# Altium footprint library Supernova Connectors.PcbLib: 303 footprints (part 13 of 19)
Each footprint in its own frame and in the unit in brackets; x right, y up, seen from the top. Pads: shape width x height; smd on the part's side, far side on the other; paste and mask are expansions set on the pad; w line width, h text height; cw(c..) or ccw(c..) is an arc to the next point about the centre after c.
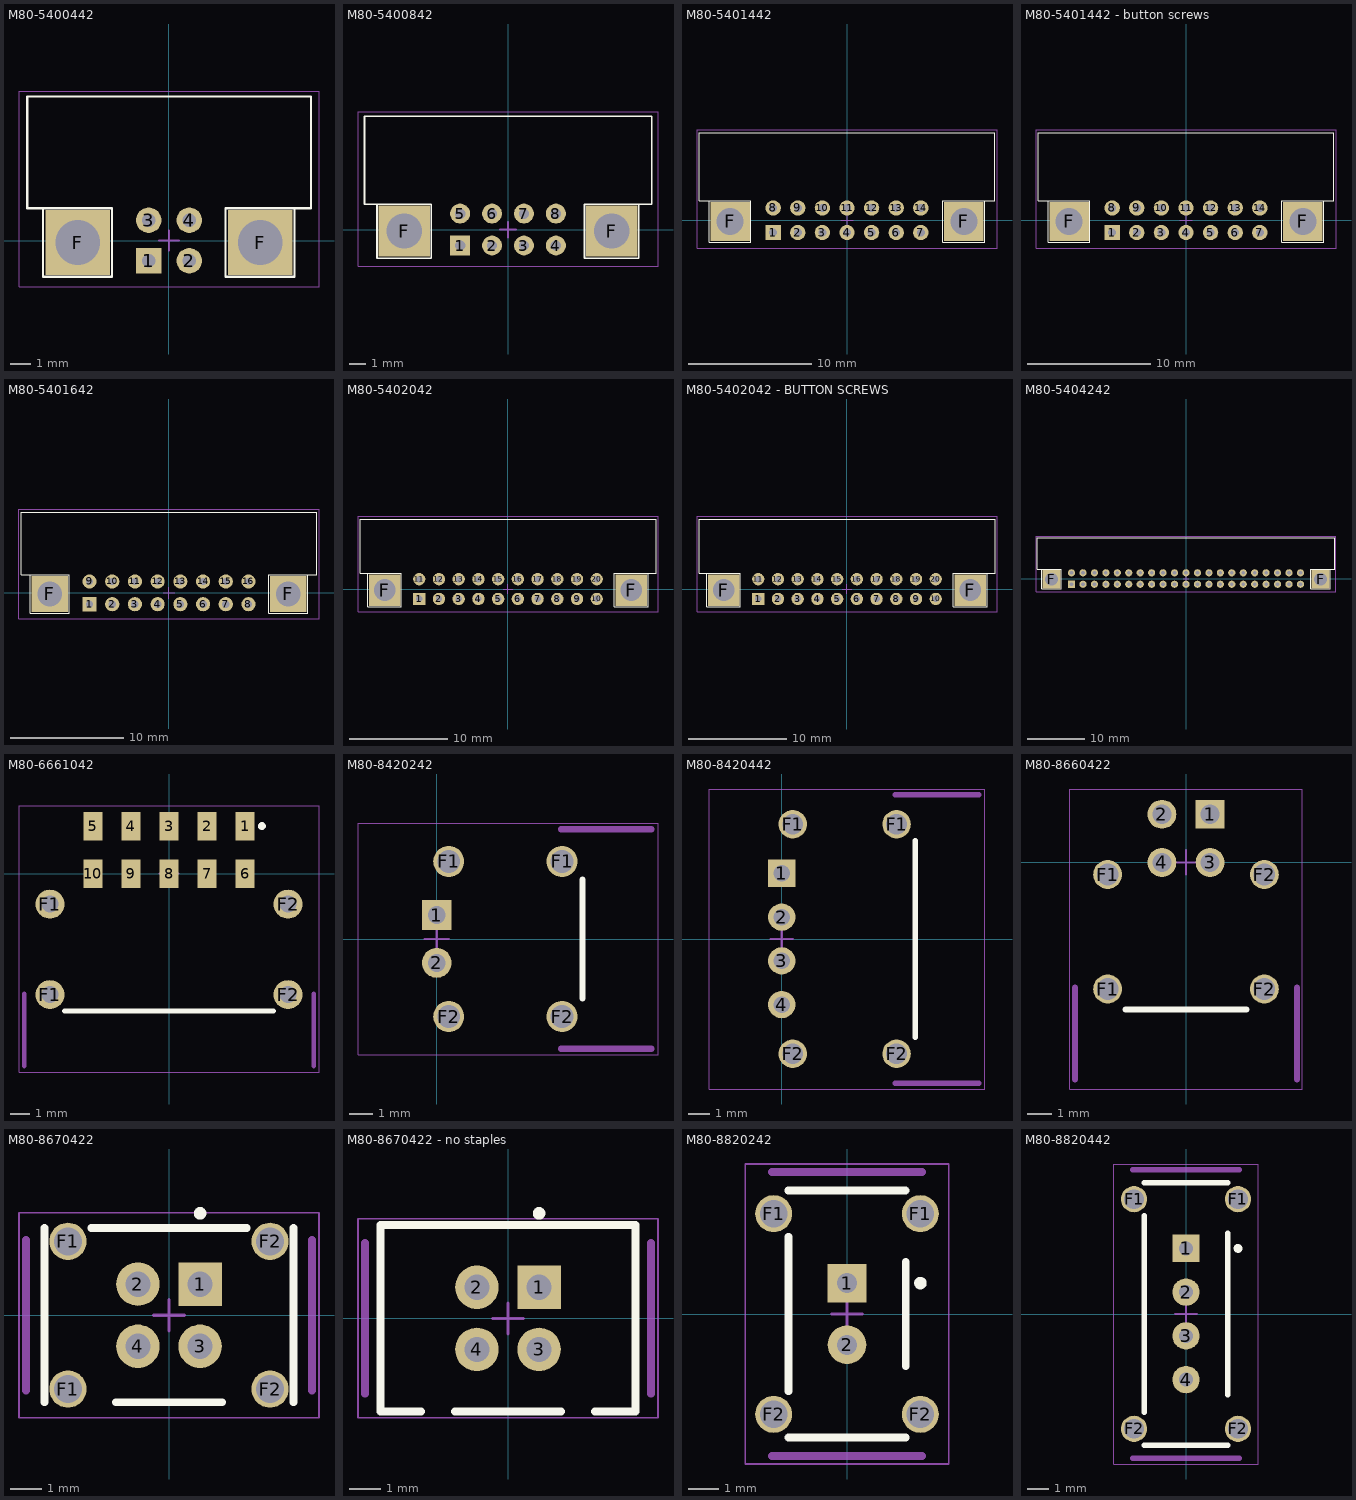
[diagram p12: the footprints below, top view; thin cyan lines are the x and y axes]

## M80-5400442 [mm] "4 pin Datamate connector Male Horizontal PC Tail"
height 5.5
pads (6):
  rect 1.25x1.25 hole 0.65 paste+0: 1(-1,-1)
  round 1.25 hole 0.65 paste+0: 2(1,-1) 3(-1,1) 4(1,1)
  rect 3.2x3.2 / inner round 4 / far side round 4 hole 2.2 paste+0 mask+0: F(-4.5,-0.1) F(4.5,-0.1)
Top Overlay:
  lines w0.1: -6.207,1.591 -6.207,-1.787 -6.028,-1.787 -2.803,-1.787 -2.803,1.591 -3.032,1.591 -5.937,1.591 -6.991,1.591 -6.991,7.1 7.009,7.1 7.009,1.591 2.793,1.591 2.793,-1.787 2.972,-1.787 6.197,-1.787 6.197,1.591
Top Courtyard:
  lines w0.05: -7.398,-2.286 7.398,-2.286 7.398,7.366 -7.398,7.366 -7.398,-2.286
  lines w0.1: -0.5,0 0.5,0 ; 0,-0.5 0,0.5
3D body "m80-5400442_asm.stp": height 6.08, standoff -3.05, extent -7,-2.093 7,7.007

## M80-5400842 [mm] "8 pin Datamate connector Male Horizontal PC Tail"
height 5.5
pads (10):
  rect 1.25x1.25 hole 0.65 paste+0: 1(-3,-1)
  round 1.25 hole 0.65 paste+0: 2(-1,-1) 3(1,-1) 4(3,-1) 5(-3,1) 6(-1,1) 7(1,1) 8(3,1)
  rect 3.2x3.2 / inner round 4 / far side round 4 hole 2.2 paste+0 mask+0: F(-6.5,-0.1) F(6.5,-0.1)
Top Overlay:
  lines w0.1: -8.207,1.591 -8.207,-1.787 -8.028,-1.787 -4.803,-1.787 -4.803,1.591 -5.032,1.591 -7.937,1.591 -8.991,1.591 -8.991,7.1 9,7.1 ; 8.197,1.591 8.197,-1.787 4.972,-1.787 4.793,-1.787 4.793,1.591 9.009,1.591 9.009,7.1
Top Courtyard:
  lines w0.05: -9.398,-2.286 9.398,-2.286 9.398,7.366 -9.398,7.366 -9.398,-2.286
  lines w0.1: -0.5,0 0.5,0 ; 0,-0.5 0,0.5
3D body "m80-5400842_asm.stp": height 6.08, standoff -3.05, extent -9,-2.1 9,7

## M80-5401442 [mm] "14 pin Datamate connector Male Horizontal PC Tail"
height 5.5
pads (16):
  rect 1.25x1.25 hole 0.65 paste+0: 1(-6,-1)
  round 1.25 hole 0.65 paste+0: 2(-4,-1) 3(-2,-1) 4(0,-1) 5(2,-1) 6(4,-1) 7(6,-1) 8(-6,1) 9(-4,1) 10(-2,1) 11(0,1) 12(2,1) 13(4,1) 14(6,1)
  rect 3.2x3.2 / inner round 4 / far side round 4 hole 2.2 paste+0 mask+0: F(-9.5,-0.1) F(9.5,-0.1)
Top Overlay:
  lines w0.1: -11.207,1.591 -11.207,-1.787 -11.028,-1.787 -7.803,-1.787 -7.803,1.591 -8.032,1.591 -10.937,1.591 -11.991,1.591 -11.991,7.1 12.009,7.1 12.009,1.591 7.793,1.591 7.793,-1.787 7.972,-1.787 11.197,-1.787 11.197,1.591
Top Courtyard:
  lines w0.05: -12.192,-2.286 -12.192,7.366 12.192,7.366 12.192,-2.286 -12.192,-2.286
  lines w0.1: -0.5,0 0.5,0 ; 0,-0.5 0,0.5
3D body "m80-5401442_asm.stp": height 6.06, standoff -3.06, extent -12,-2.1 12,7

## M80-5401442 - button screws [mm] "14 pin Datamate connector Male Horizontal PC Tail"
height 5.5
pads (16):
  rect 1.25x1.25 hole 0.65 paste+0: 1(-6,-1)
  round 1.25 hole 0.65 paste+0: 2(-4,-1) 3(-2,-1) 4(0,-1) 5(2,-1) 6(4,-1) 7(6,-1) 8(-6,1) 9(-4,1) 10(-2,1) 11(0,1) 12(2,1) 13(4,1) 14(6,1)
  rect 3.2x3.2 / inner round 4 / far side round 4 hole 2.2 paste+0 mask+0: F(-9.5,-0.1) F(9.5,-0.1)
Top Overlay:
  lines w0.1: -11.207,1.591 -11.207,-1.787 -11.028,-1.787 -7.803,-1.787 -7.803,1.591 -8.032,1.591 -10.937,1.591 -11.991,1.591 -11.991,7.1 12.009,7.1 12.009,1.591 7.793,1.591 7.793,-1.787 7.972,-1.787 11.197,-1.787 11.197,1.591
Top Courtyard:
  lines w0.05: -12.192,-2.286 12.192,-2.286 12.192,7.366 -12.192,7.366 -12.192,-2.286
  lines w0.1: -0.5,0 0.5,0 ; 0,-0.5 0,0.5
3D body "m80-5401442_asm.STEP": height 6.06, standoff -2.99, extent -12,-1.6 12,7
3D body "Screw, M2 Button.STEP": height 1.3, standoff -4, extent -11.5,-2.1 -7.5,1.9
3D body "Screw, M2 Button.STEP": height 1.3, standoff -4, extent 7.5,-2.1 11.5,1.9

## M80-5401642 [mm] "16 pin Datamate connector Male Horizontal PC Tail"
height 5.5
pads (18):
  rect 1.25x1.25 hole 0.65 paste+0: 1(-7,-1)
  round 1.25 hole 0.65 paste+0: 2(-5,-1) 3(-3,-1) 4(-1,-1) 5(1,-1) 6(3,-1) 7(5,-1) 8(7,-1) 9(-7,1) 10(-5,1) 11(-3,1) 12(-1,1) 13(1,1) 14(3,1) 15(5,1) 16(7,1)
  rect 3.2x3.2 / inner round 4 / far side round 4 hole 2.2 paste+0 mask+0: F(-10.5,-0.1) F(10.5,-0.1)
Top Overlay:
  lines w0.1: -12.207,1.591 -12.207,-1.787 -12.028,-1.787 -8.803,-1.787 -8.803,1.591 -9.032,1.591 -11.937,1.591 -12.991,1.591 -12.991,7.1 13.009,7.1 13.009,1.591 8.793,1.591 8.793,-1.787 8.972,-1.787 12.197,-1.787 12.197,1.591
Top Courtyard:
  lines w0.05: -13.208,-2.286 -13.208,7.366 13.208,7.366 13.208,-2.286 -13.208,-2.286
  lines w0.1: -0.5,0 0.5,0 ; 0,-0.5 0,0.5
3D body "m80-5401642_asm.stp": height 6.03, standoff -3.1, extent -13,-2.1 13,7

## M80-5402042 [mm] "20 pin Datamate connector Male Horizontal PC Tail"
height 5.5
pads (22):
  rect 1.25x1.25 hole 0.65 paste+0: 1(-9,-1)
  round 1.25 hole 0.65 paste+0: 2(-7,-1) 3(-5,-1) 4(-3,-1) 5(-1,-1) 6(1,-1) 7(3,-1) 8(5,-1) 9(7,-1) 10(9,-1) 11(-9,1) 12(-7,1) 13(-5,1) 14(-3,1) 15(-1,1) 16(1,1) 17(3,1) 18(5,1) 19(7,1) 20(9,1)
  rect 3.2x3.2 / inner round 4 / far side round 4 hole 2.2 paste+0 mask+0: F(-12.5,-0.1) F(12.5,-0.1)
Top Overlay:
  lines w0.1: -14.207,1.591 -14.207,-1.787 -14.028,-1.787 -10.803,-1.787 -10.803,1.591 -11.032,1.591 -13.937,1.591 -14.991,1.591 -14.991,7.1 15.009,7.1 15.009,1.591 10.793,1.591 10.793,-1.787 10.972,-1.787 14.197,-1.787 14.197,1.591
Top Courtyard:
  lines w0.05: -15.208,-2.286 15.208,-2.286 15.208,7.366 -15.208,7.366 -15.208,-2.286
  lines w0.1: -0.5,0 0.5,0 ; 0,-0.5 0,0.5
3D body "m80-5402042_asm.stp": height 6.03, standoff -3.1, extent -14.993,-2.093 15.007,7.007

## M80-5402042 - BUTTON SCREWS [mm] "20 pin Datamate connector Male Horizontal PC Tail"
height 5.5
pads (22):
  rect 1.25x1.25 hole 0.65 paste+0: 1(-9,-1)
  round 1.25 hole 0.65 paste+0: 2(-7,-1) 3(-5,-1) 4(-3,-1) 5(-1,-1) 6(1,-1) 7(3,-1) 8(5,-1) 9(7,-1) 10(9,-1) 11(-9,1) 12(-7,1) 13(-5,1) 14(-3,1) 15(-1,1) 16(1,1) 17(3,1) 18(5,1) 19(7,1) 20(9,1)
  rect 3.2x3.2 / inner round 4 / far side round 4 hole 2.2 paste+0 mask+0: F(-12.5,-0.1) F(12.5,-0.1)
Top Overlay:
  lines w0.1: -14.207,1.591 -14.207,-1.787 -14.028,-1.787 -10.803,-1.787 -10.803,1.591 -11.032,1.591 -13.937,1.591 -14.991,1.591 -14.991,7.1 15.009,7.1 15.009,1.591 10.793,1.591 10.793,-1.787 10.972,-1.787 14.197,-1.787 14.197,1.591
Top Courtyard:
  lines w0.05: -15.208,-2.286 -15.208,7.366 15.208,7.366 15.208,-2.286 -15.208,-2.286
  lines w0.1: -0.5,0 0.5,0 ; 0,-0.5 0,0.5
3D body "m80-5402042_asm.STEP": height 6.03, standoff -3.03, extent -14.993,-1.593 15.007,7.007
3D body "Screw, M2 Button.STEP": height 1.3, standoff -4, extent -14.5,-2.1 -10.5,1.9
3D body "Screw, M2 Button.STEP": height 1.3, standoff -4, extent 10.5,-2.1 14.5,1.9

## M80-5404242 [mm] "42 pin Datamate connector Male Horizontal PC Tail"
height 5.5
pads (44):
  rect 1.25x1.25 hole 0.65 paste+0: 1(-20,-1)
  round 1.25 hole 0.65 paste+0: 2(-18,-1) 3(-16,-1) 4(-14,-1) 5(-12,-1) 6(-10,-1) 7(-8,-1) 8(-6,-1) 9(-4,-1) 10(-2,-1) 11(0,-1) 12(2,-1) 13(4,-1) 14(6,-1) 15(8,-1) 16(10,-1) 17(12,-1) 18(14,-1) 19(16,-1) 20(18,-1) 21(20,-1) 22(-20,1) 23(-18,1) 24(-16,1) 25(-14,1) 26(-12,1) 27(-10,1) 28(-8,1) 29(-6,1) 30(-4,1) 31(-2,1) 32(0,1) 33(2,1) 34(4,1) 35(6,1) 36(8,1) 37(10,1) 38(12,1) 39(14,1) 40(16,1) 41(18,1) 42(20,1)
  rect 3.2x3.2 / inner round 4 / far side round 4 hole 2.2 paste+0 mask+0: F(-23.5,-0.1) F(23.5,-0.1)
Top Overlay:
  lines w0.1: -25.207,1.591 -25.207,-1.787 -25.028,-1.787 -21.803,-1.787 -21.803,1.591 -22.032,1.591 -24.937,1.591 -25.991,1.591 -25.991,7.1 26.009,7.1 26.009,1.591 21.793,1.591 21.793,-1.787 21.972,-1.787 25.197,-1.787 25.197,1.591
Top Courtyard:
  lines w0.05: -26.208,-2.286 -26.208,7.366 26.208,7.366 26.208,-2.286 -26.208,-2.286
  lines w0.1: -0.5,0 0.5,0 ; 0,-0.5 0,0.5
3D body "m80-5404242_asm.stp": height 6.03, standoff -3.1, extent -25.993,-2.093 26.007,7.007

## M80-6661042 [mm]
pads (14):
  rect 1x1.5 smd: 1(4,2.5) 2(2,2.5) 3(0,2.5) 4(-2,2.5) 5(-4,2.5) 6(4,0) 7(2,0) 8(0,0) 9(-2,0) 10(-4,0)
  round 1.524 hole 0.9: F1(-6.25,-6.35) F1(-6.25,-1.6) F2(6.25,-6.35) F2(6.25,-1.6)
Top Overlay:
  circle w0.203: c4.878,2.5 r0.102
  lines w0.254: -5.5,-7.2 5.5,-7.2
Top 3D Body:
  lines w0.254: -7.6,-10.1 -7.6,-6.3 ; 7.6,-10.1 7.6,-6.3
Top Courtyard:
  lines w0.05: -7.874,-10.414 7.874,-10.414 7.874,3.556 -7.874,3.556 -7.874,-10.414
  lines w0.1: -0.5,0 0.5,0 ; 0,-0.5 0,0.5
3D body "m80-0030006.stp": height 5.64, standoff -3, extent 5.93,-6.69 6.57,-1.31
3D body "m80-0030006.stp": height 5.64, standoff -3, extent -6.57,-6.69 -5.93,-1.31
3D body "m80-6661042_asm.stp": height 5.87, standoff 0.02, extent -6.95,-10.1 6.95,2.85

## M80-8420242 [mm]
pads (6):
  rect 1.25x1.25 hole 0.75: 1(0,1)
  round 1.25 hole 0.75: 2(0,-1)
  round 1.3 hole 0.95: F1(0.5,3.25) F1(5.25,3.25) F2(0.5,-3.25) F2(5.25,-3.25)
Top Overlay:
  lines w0.254: 6.1,-2.5 6.1,2.5
Top 3D Body:
  lines w0.254: 5.2,-4.6 9,-4.6 ; 5.2,4.6 9,4.6
Top Courtyard:
  lines w0.05: -3.302,-4.858 9.271,-4.858 9.271,4.858 -3.302,4.858 -3.302,-4.858
  lines w0.1: -0.5,0 0.5,0 ; 0,-0.5 0,0.5
3D body "m80-0030006.stp": height 4.64, standoff -4, extent 0.21,-3.57 5.59,-2.93
3D body "m80-0030006.stp": height 4.64, standoff -4, extent 0.21,2.93 5.59,3.57
3D body "m80-8420242_asm.stp": height 3.88, standoff -3.17, extent -0.237,-3.95 8.863,3.95

## M80-8420442 [mm]
pads (8):
  rect 1.25x1.25 hole 0.75: 1(0,3)
  round 1.25 hole 0.75: 2(0,1) 3(0,-1) 4(0,-3)
  round 1.3 hole 0.95: F1(0.5,5.25) F1(5.25,5.25) F2(0.5,-5.25) F2(5.25,-5.25)
Top Overlay:
  lines w0.254: 6.1,-4.5 6.1,4.5
Top 3D Body:
  lines w0.254: 5.2,-6.6 9,-6.6 ; 5.2,6.6 9,6.6
Top Courtyard:
  lines w0.05: -3.302,-6.858 9.271,-6.858 9.271,6.858 -3.302,6.858 -3.302,-6.858
  lines w0.1: -0.5,0 0.5,0 ; 0,-0.5 0,0.5
3D body "m80-8420442_asm.stp": height 3.88, standoff -3.17, extent -0.237,-5.95 8.863,5.95
3D body "m80-0030006.stp": height 4.64, standoff -4, extent 0.21,-5.57 5.59,-4.93
3D body "m80-0030006.stp": height 4.64, standoff -4, extent 0.21,4.93 5.59,5.57

## M80-8660422 [mm]
pads (8):
  rect 1.2x1.2 hole 0.8: 1(1,2)
  round 1.2 hole 0.8: 2(-1,2) 3(1,0) 4(-1,0)
  round 1.2 hole 0.9: F1(-3.25,-5.25) F1(-3.25,-0.5) F2(3.25,-5.25) F2(3.25,-0.5)
Top Overlay:
  lines w0.254: -2.5,-6.1 2.5,-6.1
Top 3D Body:
  lines w0.254: -4.6,-9 -4.6,-5.2 ; 4.6,-9 4.6,-5.2
Top Courtyard:
  lines w0.05: -4.826,-9.398 4.826,-9.398 4.826,3.048 -4.826,3.048 -4.826,-9.398
  lines w0.1: -0.5,0 0.5,0 ; 0,-0.5 0,0.5
3D body "m80-0030006.stp": height 5.64, standoff -3, extent -3.57,-5.59 -2.93,-0.21
3D body "m80-0030006.stp": height 5.64, standoff -3, extent 2.93,-5.59 3.57,-0.21
3D body "m80-8660422_asm.stp": height 5.87, standoff -3.17, extent -3.95,-8.85 3.95,2.25

## M80-8670422 [mm]
pads (8):
  rect 1.4x1.4 hole 0.813: 1(1,1)
  round 1.4 hole 0.813: 2(-1,1) 3(1,-1) 4(-1,-1)
  round 1.2 hole 0.9: F1(-3.25,-2.375) F1(-3.25,2.375) F2(3.25,-2.375) F2(3.25,2.375)
Top Overlay:
  circle w0.203: c1,3.278 r0.102
  lines w0.254: -4,-2.8 -4,2.8 ; -2.5,2.8 2.5,2.8 ; -1.7,-2.8 1.7,-2.8 ; 4,-2.8 4,2.8
Top 3D Body:
  lines w0.254: -4.6,-2.425 -4.6,2.425 ; 4.6,-2.425 4.6,2.425
Top Courtyard:
  lines w0.05: -4.826,-3.302 -4.826,3.302 4.826,3.302 4.826,-3.302 -4.826,-3.302
  lines w0.1: -0.5,0 0.5,0 ; 0,-0.5 0,0.5
3D body "m80-8670422_asm.stp": height 8.05, standoff -3.65, extent -3.95,-3.075 3.95,2.775

## M80-8670422 - no staples [mm]
pads (4):
  rect 1.4x1.4 hole 0.813: 1(1,1)
  round 1.4 hole 0.813: 2(-1,1) 3(1,-1) 4(-1,-1)
Top Overlay:
  circle w0.203: c1,3.378 r0.102
  lines w0.254: -2.8,-3 -4.1,-3 -4.1,3 4.1,3 4.1,-3 2.8,-3 ; -1.7,-3 1.7,-3
Top 3D Body:
  lines w0.254: -4.6,-2.425 -4.6,2.425 ; 4.6,-2.425 4.6,2.425
Top Courtyard:
  lines w0.05: -4.826,-3.2 -4.826,3.2 4.826,3.2 4.826,-3.2 -4.826,-3.2
  lines w0.1: -0.5,0 0.5,0 ; 0,-0.5 0,0.5
3D body "m80-8670422_asm.stp": height 8.05, standoff -3.65, extent -3.95,-3.075 3.95,2.775

## M80-8820242 [mm]
pads (6):
  rect 1.25x1.25 hole 0.65: 1(0,1)
  round 1.25 hole 0.65: 2(0,-1)
  round 1.2 hole 0.9: F1(-2.375,3.25) F1(2.375,3.25) F2(-2.375,-3.25) F2(2.375,-3.25)
Top Overlay:
  circle w0.203: c2.378,1 r0.102
  lines w0.254: -1.905,4 1.9,4 ; -1.9,-4 1.905,-4 ; -1.9,-2.5 -1.9,2.5 ; 1.905,-1.683 1.905,1.683
Top 3D Body:
  lines w0.254: -2.425,-4.6 2.425,-4.6 ; -2.425,4.6 2.425,4.6
Top Courtyard:
  lines w0.05: -3.302,-4.858 -3.302,4.858 3.302,4.858 3.302,-4.858 -3.302,-4.858
  lines w0.1: -0.5,0 0.5,0 ; 0,-0.5 0,0.5
3D body "m80-0030006.stp": height 4.94, standoff -3.7, extent -2.665,-3.57 2.715,-2.93
3D body "m80-0030006.stp": height 4.94, standoff -3.7, extent -2.665,2.93 2.715,3.57
3D body "m80-8820242_asm.stp": height 8.37, standoff -3.28, extent -1.775,-3.95 2.075,3.95

## M80-8820442 [mm]
pads (8):
  rect 1.25x1.25 hole 0.65: 1(0,3)
  round 1.25 hole 0.65: 2(0,1) 3(0,-1) 4(0,-3)
  round 1.2 hole 0.9: F1(-2.375,5.25) F1(2.375,5.25) F2(-2.375,-5.25) F2(2.375,-5.25)
Top Overlay:
  circle w0.203: c2.378,3 r0.102
  lines w0.254: -1.905,6 1.9,6 ; -1.9,-6 1.905,-6 ; -1.9,-4.5 -1.9,4.5 ; 1.905,-3.683 1.905,3.683
Top 3D Body:
  lines w0.254: -2.425,-6.6 2.425,-6.6 ; -2.425,6.6 2.425,6.6
Top Courtyard:
  lines w0.05: -3.302,-6.858 -3.302,6.858 3.302,6.858 3.302,-6.858 -3.302,-6.858
  lines w0.1: -0.5,0 0.5,0 ; 0,-0.5 0,0.5
3D body "m80-0030006.stp": height 4.94, standoff -3.7, extent -2.665,-5.57 2.715,-4.93
3D body "m80-0030006.stp": height 4.94, standoff -3.7, extent -2.665,4.93 2.715,5.57
3D body "m80-8820442_asm.stp": height 8.05, standoff -3.65, extent -1.767,-5.95 2.083,5.95